# Altium footprint library 六角铜柱.PcbLib: 49 footprints (part 2 of 4)
Each footprint in its own frame and in the unit in brackets; x right, y up, seen from the top. Pads: shape width x height; smd on the part's side, far side on the other; paste and mask are expansions set on the pad; w line width, h text height; cw(c..) or ccw(c..) is an arc to the next point about the centre after c.
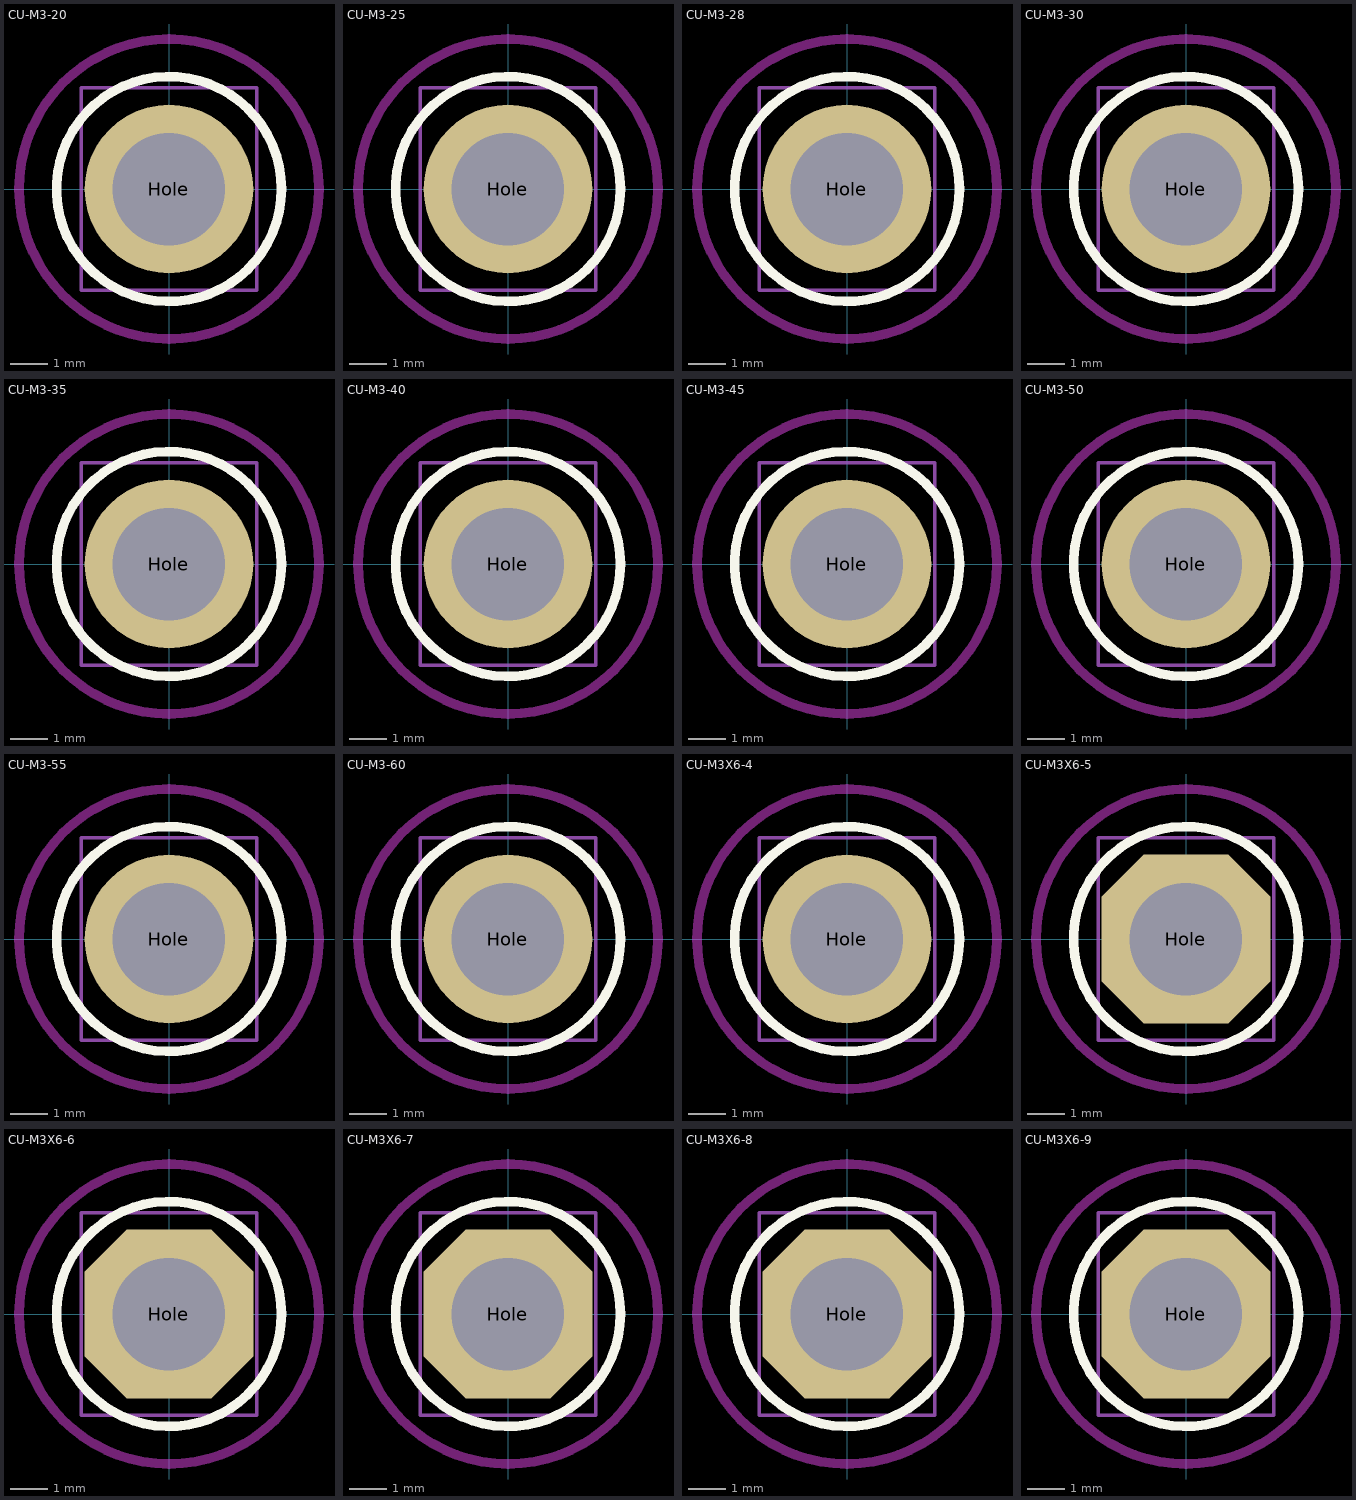
[diagram p1: the footprints below, top view; thin cyan lines are the x and y axes]

## CU-M3-20 [mm] "空心20mm长M3六角铜柱"
height 20
pads (1):
  round 4.5 hole 3: Hole(0,0)
Top Overlay:
  circle w0.254: c0,0 r3
Keep-Out Layer:
  circle w0.254: c0,0 r4
Mechanical 1:
  circle w0.15: c0,0 r1.5
Mechanical 13:
  lines w0.1: -2.34,-2.702 2.34,-2.702 2.34,2.702 -2.34,2.702 -2.34,-2.702
Mechanical 15:
  lines w0.1: -1,0 1,0 ; 0,-1 0,1
3D body: height 20, standoff 0, extent -2.34,-2.702 2.34,2.702

## CU-M3-25 [mm] "空心25mm长M3六角铜柱"
height 25
pads (1):
  round 4.5 hole 3: Hole(0,0)
Top Overlay:
  circle w0.254: c0,0 r3
Keep-Out Layer:
  circle w0.254: c0,0 r4
Mechanical 1:
  circle w0.15: c0,0 r1.5
Mechanical 13:
  lines w0.1: -2.34,-2.702 -2.34,2.702 2.34,2.702 2.34,-2.702 -2.34,-2.702
Mechanical 15:
  lines w0.1: -1,0 1,0 ; 0,-1 0,1
3D body: height 25, standoff 0, extent -2.34,-2.702 2.34,2.702

## CU-M3-28 [mm] "空心28mm长M3六角铜柱"
height 28
pads (1):
  round 4.5 hole 3: Hole(0,0)
Top Overlay:
  circle w0.254: c0,0 r3
Keep-Out Layer:
  circle w0.254: c0,0 r4
Mechanical 1:
  circle w0.15: c0,0 r1.5
Mechanical 13:
  lines w0.1: -2.34,-2.702 2.34,-2.702 2.34,2.702 -2.34,2.702 -2.34,-2.702
Mechanical 15:
  lines w0.1: -1,0 1,0 ; 0,-1 0,1
3D body: height 28, standoff 0, extent -2.34,-2.702 2.34,2.702

## CU-M3-30 [mm] "空心30mm长M3六角铜柱"
height 30
pads (1):
  round 4.5 hole 3: Hole(0,0)
Top Overlay:
  circle w0.254: c0,0 r3
Keep-Out Layer:
  circle w0.254: c0,0 r4
Mechanical 1:
  circle w0.15: c0,0 r1.5
Mechanical 13:
  lines w0.1: -2.34,-2.702 2.34,-2.702 2.34,2.702 -2.34,2.702 -2.34,-2.702
Mechanical 15:
  lines w0.1: -1,0 1,0 ; 0,-1 0,1
3D body: height 30, standoff 0, extent -2.34,-2.702 2.34,2.702

## CU-M3-35 [mm] "空心35mm长M3六角铜柱"
height 35
pads (1):
  round 4.5 hole 3: Hole(0,0)
Top Overlay:
  circle w0.254: c0,0 r3
Keep-Out Layer:
  circle w0.254: c0,0 r4
Mechanical 1:
  circle w0.15: c0,0 r1.5
Mechanical 13:
  lines w0.1: -2.34,-2.702 2.34,-2.702 2.34,2.702 -2.34,2.702 -2.34,-2.702
Mechanical 15:
  lines w0.1: -1,0 1,0 ; 0,-1 0,1
3D body: height 35, standoff 0, extent -2.34,-2.702 2.34,2.702

## CU-M3-40 [mm] "空心40mm长M3六角铜柱"
height 40
pads (1):
  round 4.5 hole 3: Hole(0,0)
Top Overlay:
  circle w0.254: c0,0 r3
Keep-Out Layer:
  circle w0.254: c0,0 r4
Mechanical 1:
  circle w0.15: c0,0 r1.5
Mechanical 13:
  lines w0.1: -2.34,-2.702 -2.34,2.702 2.34,2.702 2.34,-2.702 -2.34,-2.702
Mechanical 15:
  lines w0.1: -1,0 1,0 ; 0,-1 0,1
3D body: height 40, standoff 0, extent -2.34,-2.702 2.34,2.702

## CU-M3-45 [mm] "空心45mm长M3六角铜柱"
height 45
pads (1):
  round 4.5 hole 3: Hole(0,0)
Top Overlay:
  circle w0.254: c0,0 r3
Keep-Out Layer:
  circle w0.254: c0,0 r4
Mechanical 1:
  circle w0.15: c0,0 r1.5
Mechanical 13:
  lines w0.1: -2.34,-2.702 2.34,-2.702 2.34,2.702 -2.34,2.702 -2.34,-2.702
Mechanical 15:
  lines w0.1: -1,0 1,0 ; 0,-1 0,1
3D body: height 45, standoff 0, extent -2.34,-2.702 2.34,2.702

## CU-M3-50 [mm] "空心50mm长M3六角铜柱"
height 50
pads (1):
  round 4.5 hole 3: Hole(0,0)
Top Overlay:
  circle w0.254: c0,0 r3
Keep-Out Layer:
  circle w0.254: c0,0 r4
Mechanical 1:
  circle w0.15: c0,0 r1.5
Mechanical 13:
  lines w0.1: -2.34,-2.702 2.34,-2.702 2.34,2.702 -2.34,2.702 -2.34,-2.702
Mechanical 15:
  lines w0.1: -1,0 1,0 ; 0,-1 0,1
3D body: height 50, standoff 0, extent -2.34,-2.702 2.34,2.702

## CU-M3-55 [mm] "空心55mm长M3六角铜柱"
height 55
pads (1):
  round 4.5 hole 3: Hole(0,0)
Top Overlay:
  circle w0.254: c0,0 r3
Keep-Out Layer:
  circle w0.254: c0,0 r4
Mechanical 1:
  circle w0.15: c0,0 r1.5
Mechanical 13:
  lines w0.1: -2.34,-2.702 2.34,-2.702 2.34,2.702 -2.34,2.702 -2.34,-2.702
Mechanical 15:
  lines w0.1: -1,0 1,0 ; 0,-1 0,1
3D body: height 55, standoff 0, extent -2.34,-2.702 2.34,2.702

## CU-M3-60 [mm] "空心60mm长M3六角铜柱"
height 60
pads (1):
  round 4.5 hole 3: Hole(0,0)
Top Overlay:
  circle w0.254: c0,0 r3
Keep-Out Layer:
  circle w0.254: c0,0 r4
Mechanical 1:
  circle w0.15: c0,0 r1.5
Mechanical 13:
  lines w0.1: -2.34,-2.702 -2.34,2.702 2.34,2.702 2.34,-2.702 -2.34,-2.702
Mechanical 15:
  lines w0.1: -1,0 1,0 ; 0,-1 0,1
3D body: height 60, standoff 0, extent -2.34,-2.702 2.34,2.702

## CU-M3X6-4 [mm] "4mm长M3六角铜柱"
height 4
pads (1):
  round 4.5 hole 3: Hole(0,0)
Top Overlay:
  circle w0.254: c0,0 r3
Keep-Out Layer:
  circle w0.254: c0,0 r4
Mechanical 1:
  circle w0.15: c0,0 r1.5
Mechanical 13:
  lines w0.1: -2.34,-2.702 -2.34,2.702 2.34,2.702 2.34,-2.702 -2.34,-2.702
Mechanical 15:
  lines w0.1: -1,0 1,0 ; 0,-1 0,1
3D body: height 4, standoff -6, extent -2.34,-2.702 2.34,2.702

## CU-M3X6-5 [mm] "5mm长M3六角铜柱"
height 5
pads (1):
  oct 4.5x4.5 hole 3: Hole(0,0)
Top Overlay:
  circle w0.254: c0,0 r3
Keep-Out Layer:
  circle w0.254: c0,0 r4
Mechanical 1:
  circle w0.15: c0,0 r1.5
Mechanical 13:
  lines w0.1: -2.34,-2.702 2.34,-2.702 2.34,2.702 -2.34,2.702 -2.34,-2.702
Mechanical 15:
  lines w0.1: -1,0 1,0 ; 0,-1 0,1
3D body: height 5, standoff -6, extent -2.34,-2.702 2.34,2.702

## CU-M3X6-6 [mm] "6mm长M3六角铜柱"
height 6
pads (1):
  oct 4.5x4.5 hole 3: Hole(0,0)
Top Overlay:
  circle w0.254: c0,0 r3
Keep-Out Layer:
  circle w0.254: c0,0 r4
Mechanical 1:
  circle w0.15: c0,0 r1.5
Mechanical 13:
  lines w0.1: -2.34,-2.702 2.34,-2.702 2.34,2.702 -2.34,2.702 -2.34,-2.702
Mechanical 15:
  lines w0.1: -1,0 1,0 ; 0,-1 0,1
3D body: height 6, standoff -6, extent -2.34,-2.702 2.34,2.702

## CU-M3X6-7 [mm] "7mm长M3六角铜柱"
height 7
pads (1):
  oct 4.5x4.5 hole 3: Hole(0,0)
Top Overlay:
  circle w0.254: c0,0 r3
Keep-Out Layer:
  circle w0.254: c0,0 r4
Mechanical 1:
  circle w0.15: c0,0 r1.5
Mechanical 13:
  lines w0.1: -2.34,-2.702 2.34,-2.702 2.34,2.702 -2.34,2.702 -2.34,-2.702
Mechanical 15:
  lines w0.1: -1,0 1,0 ; 0,-1 0,1
3D body: height 7, standoff -6, extent -2.34,-2.702 2.34,2.702

## CU-M3X6-8 [mm] "8mm长M3六角铜柱"
height 8
pads (1):
  oct 4.5x4.5 hole 3: Hole(0,0)
Top Overlay:
  circle w0.254: c0,0 r3
Keep-Out Layer:
  circle w0.254: c0,0 r4
Mechanical 1:
  circle w0.15: c0,0 r1.5
Mechanical 13:
  lines w0.1: -2.34,-2.702 2.34,-2.702 2.34,2.702 -2.34,2.702 -2.34,-2.702
Mechanical 15:
  lines w0.1: -1,0 1,0 ; 0,-1 0,1
3D body: height 8, standoff -6, extent -2.34,-2.702 2.34,2.702

## CU-M3X6-9 [mm] "9mm长M3六角铜柱"
height 9
pads (1):
  oct 4.5x4.5 hole 3: Hole(0,0)
Top Overlay:
  circle w0.254: c0,0 r3
Keep-Out Layer:
  circle w0.254: c0,0 r4
Mechanical 1:
  circle w0.15: c0,0 r1.5
Mechanical 13:
  lines w0.1: -2.34,-2.702 -2.34,2.702 2.34,2.702 2.34,-2.702 -2.34,-2.702
Mechanical 15:
  lines w0.1: -1,0 1,0 ; 0,-1 0,1
3D body: height 9, standoff -6, extent -2.34,-2.702 2.34,2.702